# Altium footprint library HF_STM32F2_MCU.PcbLib: 59 footprints (part 3 of 6) (continued)
## HF_STM32F207IGHx_201P [mil] "BGA 176" (continued)
Top Overlay:
  lines w6: -208,-179.13 -198,-179.13 ; -208,-51.18 -198,-51.18 ; -208,76.77 -198,76.77 ; -76.77,-208 -76.77,-198 ; -76.77,198 -76.77,208 ; 51.18,-208 51.18,-198 ; 51.18,198 51.18,208 ; 179.13,-208 179.13,-198 ; 179.13,198 179.13,208 ; 198,-179.13 208,-179.13 ; 198,-51.18 208,-51.18 ; 198,76.77 208,76.77 ; -203,-203 203,-203 203,203 -203,203 -203,-203
Mechanical 15:
  region: 208,-208 -208,-208 -208,208 208,208
  lines w6: -208,-208 -208,208 208,208 208,-208 -208,-208
3D body "BGA 176.stp": height 24.1, standoff 0, extent -198,-198 198,198

## HF_STM32F207IGTx_L_176P [mil] "LQFP176-24x24mm"
pads (176):
  rect 58x11 smd: 1(-499,423.23) 2(-499,403.54) 3(-499,383.86) 4(-499,364.17) 5(-499,344.49) 6(-499,324.8) 7(-499,305.12) 8(-499,285.43) 9(-499,265.75) 10(-499,246.06) 11(-499,226.38) 12(-499,206.69) 13(-499,187.01) 14(-499,167.32) 15(-499,147.64) 16(-499,127.95) 17(-499,108.27) 18(-499,88.58) 19(-499,68.9) 20(-499,49.21) 21(-499,29.53) 22(-499,9.84) 23(-499,-9.84) 24(-499,-29.53) 25(-499,-49.21) 26(-499,-68.9) 27(-499,-88.58) 28(-499,-108.27) 29(-499,-127.95) 30(-499,-147.64) 31(-499,-167.32) 32(-499,-187.01) 33(-499,-206.69) 34(-499,-226.38) 35(-499,-246.06) 36(-499,-265.75) 37(-499,-285.43) 38(-499,-305.12) 39(-499,-324.8) 40(-499,-344.49) 41(-499,-364.17) 42(-499,-383.86) 43(-499,-403.54) 44(-499,-423.23) 89(499,-423.23) 90(499,-403.54) 91(499,-383.86) 92(499,-364.17) 93(499,-344.49) 94(499,-324.8) 95(499,-305.12) 96(499,-285.43) 97(499,-265.75) 98(499,-246.06) 99(499,-226.38) 100(499,-206.69) 101(499,-187.01) 102(499,-167.32) 103(499,-147.64) 104(499,-127.95) 105(499,-108.27) 106(499,-88.58) 107(499,-68.9) 108(499,-49.21) 109(499,-29.53) 110(499,-9.84) 111(499,9.84) 112(499,29.53) 113(499,49.21) 114(499,68.9) 115(499,88.58) 116(499,108.27) 117(499,127.95) 118(499,147.64) 119(499,167.32) 120(499,187.01) 121(499,206.69) 122(499,226.38) 123(499,246.06) 124(499,265.75) 125(499,285.43) 126(499,305.12) 127(499,324.8) 128(499,344.49) 129(499,364.17) 130(499,383.86) 131(499,403.54) 132(499,423.23)
  rect 11x58 smd: 45(-423.23,-499) 46(-403.54,-499) 47(-383.86,-499) 48(-364.17,-499) 49(-344.49,-499) 50(-324.8,-499) 51(-305.12,-499) 52(-285.43,-499) 53(-265.75,-499) 54(-246.06,-499) 55(-226.38,-499) 56(-206.69,-499) 57(-187.01,-499) 58(-167.32,-499) 59(-147.64,-499) 60(-127.95,-499) 61(-108.27,-499) 62(-88.58,-499) 63(-68.9,-499) 64(-49.21,-499) 65(-29.53,-499) 66(-9.84,-499) 67(9.84,-499) 68(29.53,-499) 69(49.21,-499) 70(68.9,-499) 71(88.58,-499) 72(108.27,-499) 73(127.95,-499) 74(147.64,-499) 75(167.32,-499) 76(187.01,-499) 77(206.69,-499) 78(226.38,-499) 79(246.06,-499) 80(265.75,-499) 81(285.43,-499) 82(305.12,-499) 83(324.8,-499) 84(344.49,-499) 85(364.17,-499) 86(383.86,-499) 87(403.54,-499) 88(423.23,-499) 133(423.23,499) 134(403.54,499) 135(383.86,499) 136(364.17,499) 137(344.49,499) 138(324.8,499) 139(305.12,499) 140(285.43,499) 141(265.75,499) 142(246.06,499) 143(226.38,499) 144(206.69,499) 145(187.01,499) 146(167.32,499) 147(147.64,499) 148(127.95,499) 149(108.27,499) 150(88.58,499) 151(68.9,499) 152(49.21,499) 153(29.53,499) 154(9.84,499) 155(-9.84,499) 156(-29.53,499) 157(-49.21,499) 158(-68.9,499) 159(-88.58,499) 160(-108.27,499) 161(-127.95,499) 162(-147.64,499) 163(-167.32,499) 164(-187.01,499) 165(-206.69,499) 166(-226.38,499) 167(-246.06,499) 168(-265.75,499) 169(-285.43,499) 170(-305.12,499) 171(-324.8,499) 172(-344.49,499) 173(-364.17,499) 174(-383.86,499) 175(-403.54,499) 176(-423.23,499)
Top Overlay:
  region: -538,253.56 -548,253.56 -548,238.56 -538,238.56
  region: -538,56.71 -548,56.71 -548,41.71 -538,41.71
  region: -538,-140.14 -548,-140.14 -548,-155.14 -538,-155.14
  region: -538,-336.99 -548,-336.99 -548,-351.99 -538,-351.99
  region: -317.3,-538 -332.3,-538 -332.3,-548 -317.3,-548
  region: -120.45,-538 -135.45,-538 -135.45,-548 -120.45,-548
  region: 76.4,-538 61.4,-538 61.4,-548 76.4,-548
  region: 273.25,-538 258.25,-538 258.25,-548 273.25,-548
  region: 538,-396.04 548,-396.04 548,-411.04 538,-411.04
  region: 538,-199.19 548,-199.19 548,-214.19 538,-214.19
  region: 538,-2.34 548,-2.34 548,-17.34 538,-17.34
  region: 538,194.51 548,194.51 548,179.51 538,179.51
  region: 538,391.36 548,391.36 548,376.36 538,376.36
  region: 292.93,538 277.93,538 277.93,548 292.93,548
  region: 96.08,538 81.08,538 81.08,548 96.08,548
  region: -100.77,538 -115.77,538 -115.77,548 -100.77,548
  region: -297.62,538 -312.62,538 -312.62,548 -297.62,548
  lines w6: -479.5,-441.83 -479.5,-479.5 -441.83,-479.5 ; -479.5,441.83 -479.5,479.5 -441.83,479.5 ; 441.83,-479.5 479.5,-479.5 479.5,-441.83 ; 441.83,479.5 479.5,479.5 479.5,441.83
  text "*" at -553,448.07 h50
Mechanical 15:
  region: -443.23,-484.5 -484.5,-484.5 -484.5,-443.23 -539.5,-443.23 -539.5,443.23 -484.5,443.23 -484.5,484.5 -443.23,484.5 -443.23,539.5 443.23,539.5 443.23,484.5 484.5,484.5 484.5,443.23 539.5,443.23 539.5,-443.23 484.5,-443.23 484.5,-484.5 443.23,-484.5 443.23,-539.5 -443.23,-539.5
  lines w6: -539.5,-443.23 -484.5,-443.23 -484.5,-484.5 -443.23,-484.5 -443.23,-539.5 443.23,-539.5 443.23,-484.5 484.5,-484.5 484.5,-443.23 539.5,-443.23 539.5,443.23 484.5,443.23 484.5,484.5 443.23,484.5 443.23,539.5 -443.23,539.5 -443.23,484.5 -484.5,484.5 -484.5,443.23 -539.5,443.23 -539.5,-443.23
3D body "LQFP176-24x24mm.stp": height 63.1, standoff 0, extent -514,-514 514,514

## HF_STM32F207IGTx_M_176P [mil] "LQFP176-24x24mm-"
pads (176):
  rect 70x11 smd: 1(-501,423.23) 2(-501,403.54) 3(-501,383.86) 4(-501,364.17) 5(-501,344.49) 6(-501,324.8) 7(-501,305.12) 8(-501,285.43) 9(-501,265.75) 10(-501,246.06) 11(-501,226.38) 12(-501,206.69) 13(-501,187.01) 14(-501,167.32) 15(-501,147.64) 16(-501,127.95) 17(-501,108.27) 18(-501,88.58) 19(-501,68.9) 20(-501,49.21) 21(-501,29.53) 22(-501,9.84) 23(-501,-9.84) 24(-501,-29.53) 25(-501,-49.21) 26(-501,-68.9) 27(-501,-88.58) 28(-501,-108.27) 29(-501,-127.95) 30(-501,-147.64) 31(-501,-167.32) 32(-501,-187.01) 33(-501,-206.69) 34(-501,-226.38) 35(-501,-246.06) 36(-501,-265.75) 37(-501,-285.43) 38(-501,-305.12) 39(-501,-324.8) 40(-501,-344.49) 41(-501,-364.17) 42(-501,-383.86) 43(-501,-403.54) 44(-501,-423.23) 89(501,-423.23) 90(501,-403.54) 91(501,-383.86) 92(501,-364.17) 93(501,-344.49) 94(501,-324.8) 95(501,-305.12) 96(501,-285.43) 97(501,-265.75) 98(501,-246.06) 99(501,-226.38) 100(501,-206.69) 101(501,-187.01) 102(501,-167.32) 103(501,-147.64) 104(501,-127.95) 105(501,-108.27) 106(501,-88.58) 107(501,-68.9) 108(501,-49.21) 109(501,-29.53) 110(501,-9.84) 111(501,9.84) 112(501,29.53) 113(501,49.21) 114(501,68.9) 115(501,88.58) 116(501,108.27) 117(501,127.95) 118(501,147.64) 119(501,167.32) 120(501,187.01) 121(501,206.69) 122(501,226.38) 123(501,246.06) 124(501,265.75) 125(501,285.43) 126(501,305.12) 127(501,324.8) 128(501,344.49) 129(501,364.17) 130(501,383.86) 131(501,403.54) 132(501,423.23)
  rect 11x70 smd: 45(-423.23,-501) 46(-403.54,-501) 47(-383.86,-501) 48(-364.17,-501) 49(-344.49,-501) 50(-324.8,-501) 51(-305.12,-501) 52(-285.43,-501) 53(-265.75,-501) 54(-246.06,-501) 55(-226.38,-501) 56(-206.69,-501) 57(-187.01,-501) 58(-167.32,-501) 59(-147.64,-501) 60(-127.95,-501) 61(-108.27,-501) 62(-88.58,-501) 63(-68.9,-501) 64(-49.21,-501) 65(-29.53,-501) 66(-9.84,-501) 67(9.84,-501) 68(29.53,-501) 69(49.21,-501) 70(68.9,-501) 71(88.58,-501) 72(108.27,-501) 73(127.95,-501) 74(147.64,-501) 75(167.32,-501) 76(187.01,-501) 77(206.69,-501) 78(226.38,-501) 79(246.06,-501) 80(265.75,-501) 81(285.43,-501) 82(305.12,-501) 83(324.8,-501) 84(344.49,-501) 85(364.17,-501) 86(383.86,-501) 87(403.54,-501) 88(423.23,-501) 133(423.23,501) 134(403.54,501) 135(383.86,501) 136(364.17,501) 137(344.49,501) 138(324.8,501) 139(305.12,501) 140(285.43,501) 141(265.75,501) 142(246.06,501) 143(226.38,501) 144(206.69,501) 145(187.01,501) 146(167.32,501) 147(147.64,501) 148(127.95,501) 149(108.27,501) 150(88.58,501) 151(68.9,501) 152(49.21,501) 153(29.53,501) 154(9.84,501) 155(-9.84,501) 156(-29.53,501) 157(-49.21,501) 158(-68.9,501) 159(-88.58,501) 160(-108.27,501) 161(-127.95,501) 162(-147.64,501) 163(-167.32,501) 164(-187.01,501) 165(-206.69,501) 166(-226.38,501) 167(-246.06,501) 168(-265.75,501) 169(-285.43,501) 170(-305.12,501) 171(-324.8,501) 172(-344.49,501) 173(-364.17,501) 174(-383.86,501) 175(-403.54,501) 176(-423.23,501)
Top Overlay:
  region: -546,253.56 -556,253.56 -556,238.56 -546,238.56
  region: -546,56.71 -556,56.71 -556,41.71 -546,41.71
  region: -546,-140.14 -556,-140.14 -556,-155.14 -546,-155.14
  region: -546,-336.99 -556,-336.99 -556,-351.99 -546,-351.99
  region: -317.3,-546 -332.3,-546 -332.3,-556 -317.3,-556
  region: -120.45,-546 -135.45,-546 -135.45,-556 -120.45,-556
  region: 76.4,-546 61.4,-546 61.4,-556 76.4,-556
  region: 273.25,-546 258.25,-546 258.25,-556 273.25,-556
  region: 546,-396.04 556,-396.04 556,-411.04 546,-411.04
  region: 546,-199.19 556,-199.19 556,-214.19 546,-214.19
  region: 546,-2.34 556,-2.34 556,-17.34 546,-17.34
  region: 546,194.51 556,194.51 556,179.51 546,179.51
  region: 546,391.36 556,391.36 556,376.36 546,376.36
  region: 292.93,546 277.93,546 277.93,556 292.93,556
  region: 96.08,546 81.08,546 81.08,556 96.08,556
  region: -100.77,546 -115.77,546 -115.77,556 -100.77,556
  region: -297.62,546 -312.62,546 -312.62,556 -297.62,556
  lines w6: -479.5,-441.83 -479.5,-479.5 -441.83,-479.5 ; -479.5,441.83 -479.5,479.5 -441.83,479.5 ; 441.83,-479.5 479.5,-479.5 479.5,-441.83 ; 441.83,479.5 479.5,479.5 479.5,441.83
  text "*" at -561,448.07 h50
Mechanical 13:
  text "*" at -459.5,433.07 h50
Mechanical 15:
  region: -463.23,-494.5 -494.5,-494.5 -494.5,-463.23 -559.5,-463.23 -559.5,463.23 -494.5,463.23 -494.5,494.5 -463.23,494.5 -463.23,559.5 463.23,559.5 463.23,494.5 494.5,494.5 494.5,463.23 559.5,463.23 559.5,-463.23 494.5,-463.23 494.5,-494.5 463.23,-494.5 463.23,-559.5 -463.23,-559.5
  lines w6: -559.5,-463.23 -494.5,-463.23 -494.5,-494.5 -463.23,-494.5 -463.23,-559.5 463.23,-559.5 463.23,-494.5 494.5,-494.5 494.5,-463.23 559.5,-463.23 559.5,463.23 494.5,463.23 494.5,494.5 463.23,494.5 463.23,559.5 -463.23,559.5 -463.23,494.5 -494.5,494.5 -494.5,463.23 -559.5,463.23 -559.5,-463.23
3D body "LQFP176-24x24mm-.stp": height 63.1, standoff 0, extent -514,-514 514,514

## HF_STM32F207IGTx_N_176P [mil] "LQFP176-24x24m00"
pads (176):
  rect 46x11 smd: 1(-497,423.23) 2(-497,403.54) 3(-497,383.86) 4(-497,364.17) 5(-497,344.49) 6(-497,324.8) 7(-497,305.12) 8(-497,285.43) 9(-497,265.75) 10(-497,246.06) 11(-497,226.38) 12(-497,206.69) 13(-497,187.01) 14(-497,167.32) 15(-497,147.64) 16(-497,127.95) 17(-497,108.27) 18(-497,88.58) 19(-497,68.9) 20(-497,49.21) 21(-497,29.53) 22(-497,9.84) 23(-497,-9.84) 24(-497,-29.53) 25(-497,-49.21) 26(-497,-68.9) 27(-497,-88.58) 28(-497,-108.27) 29(-497,-127.95) 30(-497,-147.64) 31(-497,-167.32) 32(-497,-187.01) 33(-497,-206.69) 34(-497,-226.38) 35(-497,-246.06) 36(-497,-265.75) 37(-497,-285.43) 38(-497,-305.12) 39(-497,-324.8) 40(-497,-344.49) 41(-497,-364.17) 42(-497,-383.86) 43(-497,-403.54) 44(-497,-423.23) 89(497,-423.23) 90(497,-403.54) 91(497,-383.86) 92(497,-364.17) 93(497,-344.49) 94(497,-324.8) 95(497,-305.12) 96(497,-285.43) 97(497,-265.75) 98(497,-246.06) 99(497,-226.38) 100(497,-206.69) 101(497,-187.01) 102(497,-167.32) 103(497,-147.64) 104(497,-127.95) 105(497,-108.27) 106(497,-88.58) 107(497,-68.9) 108(497,-49.21) 109(497,-29.53) 110(497,-9.84) 111(497,9.84) 112(497,29.53) 113(497,49.21) 114(497,68.9) 115(497,88.58) 116(497,108.27) 117(497,127.95) 118(497,147.64) 119(497,167.32) 120(497,187.01) 121(497,206.69) 122(497,226.38) 123(497,246.06) 124(497,265.75) 125(497,285.43) 126(497,305.12) 127(497,324.8) 128(497,344.49) 129(497,364.17) 130(497,383.86) 131(497,403.54) 132(497,423.23)
  rect 11x46 smd: 45(-423.23,-497) 46(-403.54,-497) 47(-383.86,-497) 48(-364.17,-497) 49(-344.49,-497) 50(-324.8,-497) 51(-305.12,-497) 52(-285.43,-497) 53(-265.75,-497) 54(-246.06,-497) 55(-226.38,-497) 56(-206.69,-497) 57(-187.01,-497) 58(-167.32,-497) 59(-147.64,-497) 60(-127.95,-497) 61(-108.27,-497) 62(-88.58,-497) 63(-68.9,-497) 64(-49.21,-497) 65(-29.53,-497) 66(-9.84,-497) 67(9.84,-497) 68(29.53,-497) 69(49.21,-497) 70(68.9,-497) 71(88.58,-497) 72(108.27,-497) 73(127.95,-497) 74(147.64,-497) 75(167.32,-497) 76(187.01,-497) 77(206.69,-497) 78(226.38,-497) 79(246.06,-497) 80(265.75,-497) 81(285.43,-497) 82(305.12,-497) 83(324.8,-497) 84(344.49,-497) 85(364.17,-497) 86(383.86,-497) 87(403.54,-497) 88(423.23,-497) 133(423.23,497) 134(403.54,497) 135(383.86,497) 136(364.17,497) 137(344.49,497) 138(324.8,497) 139(305.12,497) 140(285.43,497) 141(265.75,497) 142(246.06,497) 143(226.38,497) 144(206.69,497) 145(187.01,497) 146(167.32,497) 147(147.64,497) 148(127.95,497) 149(108.27,497) 150(88.58,497) 151(68.9,497) 152(49.21,497) 153(29.53,497) 154(9.84,497) 155(-9.84,497) 156(-29.53,497) 157(-49.21,497) 158(-68.9,497) 159(-88.58,497) 160(-108.27,497) 161(-127.95,497) 162(-147.64,497) 163(-167.32,497) 164(-187.01,497) 165(-206.69,497) 166(-226.38,497) 167(-246.06,497) 168(-265.75,497) 169(-285.43,497) 170(-305.12,497) 171(-324.8,497) 172(-344.49,497) 173(-364.17,497) 174(-383.86,497) 175(-403.54,497) 176(-423.23,497)
Top Overlay:
  region: -297.62,530 -312.62,530 -312.62,540 -297.62,540
  region: -100.77,530 -115.77,530 -115.77,540 -100.77,540
  region: 96.08,530 81.08,530 81.08,540 96.08,540
  region: 292.93,530 277.93,530 277.93,540 292.93,540
  region: 530,391.36 540,391.36 540,376.36 530,376.36
  region: 530,194.51 540,194.51 540,179.51 530,179.51
  region: 530,-2.34 540,-2.34 540,-17.34 530,-17.34
  region: 530,-199.19 540,-199.19 540,-214.19 530,-214.19
  region: 530,-396.04 540,-396.04 540,-411.04 530,-411.04
  region: 273.25,-530 258.25,-530 258.25,-540 273.25,-540
  region: 76.4,-530 61.4,-530 61.4,-540 76.4,-540
  region: -120.45,-530 -135.45,-530 -135.45,-540 -120.45,-540
  region: -317.3,-530 -332.3,-530 -332.3,-540 -317.3,-540
  region: -530,-336.99 -540,-336.99 -540,-351.99 -530,-351.99
  region: -530,-140.14 -540,-140.14 -540,-155.14 -530,-155.14
  region: -530,56.71 -540,56.71 -540,41.71 -530,41.71
  region: -530,253.56 -540,253.56 -540,238.56 -530,238.56
  lines w6: -479.5,-441.83 -479.5,-479.5 -441.83,-479.5 ; -479.5,441.83 -479.5,479.5 -441.83,479.5 ; 441.83,-479.5 479.5,-479.5 479.5,-441.83 ; 441.83,479.5 479.5,479.5 479.5,441.83
  text "*" at -545,448.07 h50
Mechanical 13:
  text "*" at -459.5,433.07 h50
Mechanical 15:
  region: -431.23,-478.5 -478.5,-478.5 -478.5,-431.23 -527.5,-431.23 -527.5,431.23 -478.5,431.23 -478.5,478.5 -431.23,478.5 -431.23,527.5 431.23,527.5 431.23,478.5 478.5,478.5 478.5,431.23 527.5,431.23 527.5,-431.23 478.5,-431.23 478.5,-478.5 431.23,-478.5 431.23,-527.5 -431.23,-527.5
  lines w6: -527.5,-431.23 -527.5,431.23 -478.5,431.23 -478.5,478.5 -431.23,478.5 -431.23,527.5 431.23,527.5 431.23,478.5 478.5,478.5 478.5,431.23 527.5,431.23 527.5,-431.23 478.5,-431.23 478.5,-478.5 431.23,-478.5 431.23,-527.5 -431.23,-527.5 -431.23,-478.5 -478.5,-478.5 -478.5,-431.23 -527.5,-431.23
3D body "LQFP176-24x24m00.stp": height 63.1, standoff 0, extent -514,-514 514,514

## HF_STM32F207VCTx_100P [mil] "LQFP100-14x14mm"
pads (100):
  rect 47x12 smd: 1(-305.12,236.22) 2(-305.12,216.54) 3(-305.12,196.85) 4(-305.12,177.17) 5(-305.12,157.48) 6(-305.12,137.8) 7(-305.12,118.11) 8(-305.12,98.43) 9(-305.12,78.74) 10(-305.12,59.06) 11(-305.12,39.37) 12(-305.12,19.69) 13(-305.12,0) 14(-305.12,-19.68) 15(-305.12,-39.37) 16(-305.12,-59.06) 17(-305.12,-78.74) 18(-305.12,-98.43) 19(-305.12,-118.11) 20(-305.12,-137.8) 21(-305.12,-157.48) 22(-305.12,-177.17) 23(-305.12,-196.85) 24(-305.12,-216.54) 25(-305.12,-236.22) 51(305.12,-236.22) 52(305.12,-216.54) 53(305.12,-196.85) 54(305.12,-177.17) 55(305.12,-157.48) 56(305.12,-137.8) 57(305.12,-118.11) 58(305.12,-98.43) 59(305.12,-78.74) 60(305.12,-59.06) 61(305.12,-39.37) 62(305.12,-19.68) 63(305.12,0) 64(305.12,19.68) 65(305.12,39.37) 66(305.12,59.06) 67(305.12,78.74) 68(305.12,98.43) 69(305.12,118.11) 70(305.12,137.8) 71(305.12,157.48) 72(305.12,177.17) 73(305.12,196.85) 74(305.12,216.54) 75(305.12,236.22)
  rect 12x47 smd: 26(-236.22,-305.12) 27(-216.54,-305.12) 28(-196.85,-305.12) 29(-177.17,-305.12) 30(-157.48,-305.12) 31(-137.8,-305.12) 32(-118.11,-305.12) 33(-98.43,-305.12) 34(-78.74,-305.12) 35(-59.06,-305.12) 36(-39.37,-305.12) 37(-19.68,-305.12) 38(0,-305.12) 39(19.68,-305.12) 40(39.37,-305.12) 41(59.06,-305.12) 42(78.74,-305.12) 43(98.43,-305.12) 44(118.11,-305.12) 45(137.8,-305.12) 46(157.48,-305.12) 47(177.17,-305.12) 48(196.85,-305.12) 49(216.54,-305.12) 50(236.22,-305.12) 76(236.22,305.12) 77(216.54,305.12) 78(196.85,305.12) 79(177.17,305.12) 80(157.48,305.12) 81(137.8,305.12) 82(118.11,305.12) 83(98.43,305.12) 84(78.74,305.12) 85(59.06,305.12) 86(39.37,305.12) 87(19.68,305.12) 88(0,305.12) 89(-19.68,305.12) 90(-39.37,305.12) 91(-59.06,305.12) 92(-78.74,305.12) 93(-98.43,305.12) 94(-118.11,305.12) 95(-137.8,305.12) 96(-157.48,305.12) 97(-177.17,305.12) 98(-196.85,305.12) 99(-216.54,305.12) 100(-236.22,305.12)
Top Overlay:
  circle w6: c-348.46,236.22 r3
  region: -228.72,338.62 -243.72,338.62 -243.72,348.62 -228.72,348.62
  region: -31.87,338.62 -46.87,338.62 -46.87,348.62 -31.87,348.62
  region: 164.98,338.62 149.98,338.62 149.98,348.62 164.98,348.62
  region: 338.62,145.3 348.62,145.3 348.62,130.3 338.62,130.3
  region: 338.62,-51.56 348.62,-51.56 348.62,-66.56 338.62,-66.56
  region: 243.72,-338.62 228.72,-338.62 228.72,-348.62 243.72,-348.62
  region: 46.87,-338.62 31.87,-338.62 31.87,-348.62 46.87,-348.62
  region: -149.98,-338.62 -164.98,-338.62 -164.98,-348.62 -149.98,-348.62
  region: -338.62,-130.3 -348.62,-130.3 -348.62,-145.3 -338.62,-145.3
  region: -338.62,66.56 -348.62,66.56 -348.62,51.56 -338.62,51.56
  lines w6: -284.5,-255.32 -284.5,-284.5 -255.32,-284.5 ; -284.5,255.32 -284.5,284.5 -255.32,284.5 ; 255.32,-284.5 284.5,-284.5 284.5,-255.32 ; 255.32,284.5 284.5,284.5 284.5,255.32
Mechanical 13:
  circle w0: c-256.62,236.22 r3
Mechanical 15:
  region: -256.22,-289.5 -289.5,-289.5 -289.5,-256.22 -348.62,-256.22 -348.62,256.22 -289.5,256.22 -289.5,289.5 -256.22,289.5 -256.22,348.62 256.22,348.62 256.22,289.5 289.5,289.5 289.5,256.22 348.62,256.22 348.62,-256.22 289.5,-256.22 289.5,-289.5 256.22,-289.5 256.22,-348.62 -256.22,-348.62
  lines w6: -348.62,-256.22 -348.62,256.22 -289.5,256.22 -289.5,289.5 -256.22,289.5 -256.22,348.62 256.22,348.62 256.22,289.5 289.5,289.5 289.5,256.22 348.62,256.22 348.62,-256.22 289.5,-256.22 289.5,-289.5 256.22,-289.5 256.22,-348.62 -256.22,-348.62 -256.22,-289.5 -289.5,-289.5 -289.5,-256.22 -348.62,-256.22
3D body "LQFP100-14x14mm.stp": height 63.1, standoff 0, extent -314.84,-314.84 314.84,314.84

## HF_STM32F207VETx_100P [mil] "LQFP100-14x14mm"
pads (100):
  rect 47x12 smd: 1(-305.12,236.22) 2(-305.12,216.54) 3(-305.12,196.85) 4(-305.12,177.17) 5(-305.12,157.48) 6(-305.12,137.8) 7(-305.12,118.11) 8(-305.12,98.43) 9(-305.12,78.74) 10(-305.12,59.06) 11(-305.12,39.37) 12(-305.12,19.69) 13(-305.12,0) 14(-305.12,-19.68) 15(-305.12,-39.37) 16(-305.12,-59.06) 17(-305.12,-78.74) 18(-305.12,-98.43) 19(-305.12,-118.11) 20(-305.12,-137.8) 21(-305.12,-157.48) 22(-305.12,-177.17) 23(-305.12,-196.85) 24(-305.12,-216.54) 25(-305.12,-236.22) 51(305.12,-236.22) 52(305.12,-216.54) 53(305.12,-196.85) 54(305.12,-177.17) 55(305.12,-157.48) 56(305.12,-137.8) 57(305.12,-118.11) 58(305.12,-98.43) 59(305.12,-78.74) 60(305.12,-59.06) 61(305.12,-39.37) 62(305.12,-19.68) 63(305.12,0) 64(305.12,19.68) 65(305.12,39.37) 66(305.12,59.06) 67(305.12,78.74) 68(305.12,98.43) 69(305.12,118.11) 70(305.12,137.8) 71(305.12,157.48) 72(305.12,177.17) 73(305.12,196.85) 74(305.12,216.54) 75(305.12,236.22)
  rect 12x47 smd: 26(-236.22,-305.12) 27(-216.54,-305.12) 28(-196.85,-305.12) 29(-177.17,-305.12) 30(-157.48,-305.12) 31(-137.8,-305.12) 32(-118.11,-305.12) 33(-98.43,-305.12) 34(-78.74,-305.12) 35(-59.06,-305.12) 36(-39.37,-305.12) 37(-19.68,-305.12) 38(0,-305.12) 39(19.68,-305.12) 40(39.37,-305.12) 41(59.06,-305.12) 42(78.74,-305.12) 43(98.43,-305.12) 44(118.11,-305.12) 45(137.8,-305.12) 46(157.48,-305.12) 47(177.17,-305.12) 48(196.85,-305.12) 49(216.54,-305.12) 50(236.22,-305.12) 76(236.22,305.12) 77(216.54,305.12) 78(196.85,305.12) 79(177.17,305.12) 80(157.48,305.12) 81(137.8,305.12) 82(118.11,305.12) 83(98.43,305.12) 84(78.74,305.12) 85(59.06,305.12) 86(39.37,305.12) 87(19.68,305.12) 88(0,305.12) 89(-19.68,305.12) 90(-39.37,305.12) 91(-59.06,305.12) 92(-78.74,305.12) 93(-98.43,305.12) 94(-118.11,305.12) 95(-137.8,305.12) 96(-157.48,305.12) 97(-177.17,305.12) 98(-196.85,305.12) 99(-216.54,305.12) 100(-236.22,305.12)
Top Overlay:
  circle w6: c-348.46,236.22 r3
  region: -228.72,338.62 -243.72,338.62 -243.72,348.62 -228.72,348.62
  region: -31.87,338.62 -46.87,338.62 -46.87,348.62 -31.87,348.62
  region: 164.98,338.62 149.98,338.62 149.98,348.62 164.98,348.62
  region: 338.62,145.3 348.62,145.3 348.62,130.3 338.62,130.3
  region: 338.62,-51.56 348.62,-51.56 348.62,-66.56 338.62,-66.56
  region: 243.72,-338.62 228.72,-338.62 228.72,-348.62 243.72,-348.62
  region: 46.87,-338.62 31.87,-338.62 31.87,-348.62 46.87,-348.62
  region: -149.98,-338.62 -164.98,-338.62 -164.98,-348.62 -149.98,-348.62
  region: -338.62,-130.3 -348.62,-130.3 -348.62,-145.3 -338.62,-145.3
  region: -338.62,66.56 -348.62,66.56 -348.62,51.56 -338.62,51.56
  lines w6: -284.5,-255.32 -284.5,-284.5 -255.32,-284.5 ; -284.5,255.32 -284.5,284.5 -255.32,284.5 ; 255.32,-284.5 284.5,-284.5 284.5,-255.32 ; 255.32,284.5 284.5,284.5 284.5,255.32
Mechanical 13:
  circle w0: c-256.62,236.22 r3
Mechanical 15:
  region: -256.22,-289.5 -289.5,-289.5 -289.5,-256.22 -348.62,-256.22 -348.62,256.22 -289.5,256.22 -289.5,289.5 -256.22,289.5 -256.22,348.62 256.22,348.62 256.22,289.5 289.5,289.5 289.5,256.22 348.62,256.22 348.62,-256.22 289.5,-256.22 289.5,-289.5 256.22,-289.5 256.22,-348.62 -256.22,-348.62
  lines w6: -348.62,-256.22 -348.62,256.22 -289.5,256.22 -289.5,289.5 -256.22,289.5 -256.22,348.62 256.22,348.62 256.22,289.5 289.5,289.5 289.5,256.22 348.62,256.22 348.62,-256.22 289.5,-256.22 289.5,-289.5 256.22,-289.5 256.22,-348.62 -256.22,-348.62 -256.22,-289.5 -289.5,-289.5 -289.5,-256.22 -348.62,-256.22
3D body "LQFP100-14x14mm.stp": height 63.1, standoff 0, extent -314.84,-314.84 314.84,314.84

## HF_STM32F207VFTx_100P [mil] "LQFP100-14x14mm"
pads (100):
  rect 47x12 smd: 1(-305.12,236.22) 2(-305.12,216.54) 3(-305.12,196.85) 4(-305.12,177.17) 5(-305.12,157.48) 6(-305.12,137.8) 7(-305.12,118.11) 8(-305.12,98.43) 9(-305.12,78.74) 10(-305.12,59.06) 11(-305.12,39.37) 12(-305.12,19.69) 13(-305.12,0) 14(-305.12,-19.68) 15(-305.12,-39.37) 16(-305.12,-59.06) 17(-305.12,-78.74) 18(-305.12,-98.43) 19(-305.12,-118.11) 20(-305.12,-137.8) 21(-305.12,-157.48) 22(-305.12,-177.17) 23(-305.12,-196.85) 24(-305.12,-216.54) 25(-305.12,-236.22) 51(305.12,-236.22) 52(305.12,-216.54) 53(305.12,-196.85) 54(305.12,-177.17) 55(305.12,-157.48) 56(305.12,-137.8) 57(305.12,-118.11) 58(305.12,-98.43) 59(305.12,-78.74) 60(305.12,-59.06) 61(305.12,-39.37) 62(305.12,-19.68) 63(305.12,0) 64(305.12,19.68) 65(305.12,39.37) 66(305.12,59.06) 67(305.12,78.74) 68(305.12,98.43) 69(305.12,118.11) 70(305.12,137.8) 71(305.12,157.48) 72(305.12,177.17) 73(305.12,196.85) 74(305.12,216.54) 75(305.12,236.22)
  rect 12x47 smd: 26(-236.22,-305.12) 27(-216.54,-305.12) 28(-196.85,-305.12) 29(-177.17,-305.12) 30(-157.48,-305.12) 31(-137.8,-305.12) 32(-118.11,-305.12) 33(-98.43,-305.12) 34(-78.74,-305.12) 35(-59.06,-305.12) 36(-39.37,-305.12) 37(-19.68,-305.12) 38(0,-305.12) 39(19.68,-305.12) 40(39.37,-305.12) 41(59.06,-305.12) 42(78.74,-305.12) 43(98.43,-305.12) 44(118.11,-305.12) 45(137.8,-305.12) 46(157.48,-305.12) 47(177.17,-305.12) 48(196.85,-305.12) 49(216.54,-305.12) 50(236.22,-305.12) 76(236.22,305.12) 77(216.54,305.12) 78(196.85,305.12) 79(177.17,305.12) 80(157.48,305.12) 81(137.8,305.12) 82(118.11,305.12) 83(98.43,305.12) 84(78.74,305.12) 85(59.06,305.12) 86(39.37,305.12) 87(19.68,305.12) 88(0,305.12) 89(-19.68,305.12) 90(-39.37,305.12) 91(-59.06,305.12) 92(-78.74,305.12) 93(-98.43,305.12) 94(-118.11,305.12) 95(-137.8,305.12) 96(-157.48,305.12) 97(-177.17,305.12) 98(-196.85,305.12) 99(-216.54,305.12) 100(-236.22,305.12)
Top Overlay:
  circle w6: c-348.46,236.22 r3
  region: -338.62,66.56 -348.62,66.56 -348.62,51.56 -338.62,51.56
  region: -338.62,-130.3 -348.62,-130.3 -348.62,-145.3 -338.62,-145.3
  region: -149.98,-338.62 -164.98,-338.62 -164.98,-348.62 -149.98,-348.62
  region: 46.87,-338.62 31.87,-338.62 31.87,-348.62 46.87,-348.62
  region: 243.72,-338.62 228.72,-338.62 228.72,-348.62 243.72,-348.62
  region: 338.62,-51.56 348.62,-51.56 348.62,-66.56 338.62,-66.56
  region: 338.62,145.3 348.62,145.3 348.62,130.3 338.62,130.3
  region: 164.98,338.62 149.98,338.62 149.98,348.62 164.98,348.62
  region: -31.87,338.62 -46.87,338.62 -46.87,348.62 -31.87,348.62
  region: -228.72,338.62 -243.72,338.62 -243.72,348.62 -228.72,348.62
  lines w6: -284.5,-255.32 -284.5,-284.5 -255.32,-284.5 ; -284.5,255.32 -284.5,284.5 -255.32,284.5 ; 255.32,-284.5 284.5,-284.5 284.5,-255.32 ; 255.32,284.5 284.5,284.5 284.5,255.32
Mechanical 13:
  circle w0: c-256.62,236.22 r3
Mechanical 15:
  region: -256.22,-289.5 -289.5,-289.5 -289.5,-256.22 -348.62,-256.22 -348.62,256.22 -289.5,256.22 -289.5,289.5 -256.22,289.5 -256.22,348.62 256.22,348.62 256.22,289.5 289.5,289.5 289.5,256.22 348.62,256.22 348.62,-256.22 289.5,-256.22 289.5,-289.5 256.22,-289.5 256.22,-348.62 -256.22,-348.62
  lines w6: -348.62,-256.22 -289.5,-256.22 -289.5,-289.5 -256.22,-289.5 -256.22,-348.62 256.22,-348.62 256.22,-289.5 289.5,-289.5 289.5,-256.22 348.62,-256.22 348.62,256.22 289.5,256.22 289.5,289.5 256.22,289.5 256.22,348.62 -256.22,348.62 -256.22,289.5 -289.5,289.5 -289.5,256.22 -348.62,256.22 -348.62,-256.22
3D body "LQFP100-14x14mm.stp": height 63.1, standoff 0, extent -314.84,-314.84 314.84,314.84